# Altium schematic symbol library AD_Lib.SchLib: 1239 symbols (part 5 of 9) (continued)
## J_ESQ-116-33-L-D
designator J?, comment F2*8
Ë«ÅÅÄ¸,2*8,2.54mm; Manufacturer: Samtec; other: Òý½Å¼ä¾à2.54mm; Quality: -55~105¡ãC; pro-environment: RoHS; SN: 03.4.31.35.99EQ1601S; OPN: ESQ-116-33-L-D; PadsNum: 0; Value: Ë«ÅÅÄ¸,2*8; Category: Á¬½ÓÆ÷; Part: F2*8; Price: ?; OPN_JLC: OPN_JLC; SN_JLC: SN_JLC; Price_JLC: 0
footprint HDR2*8 (Connector; Header; 8x2 Position;Pitch=2.54mm)
pins: 1, 2, 3, 4, 5, 6, 7, 8, 9, 10, 11, 12, 13, 14

## J_HDR1*2
designator J?, comment HDR1*2
µ¥ÅÅÄ¸,1*2; Manufacturer: Samtec; other: Òý½Å¼ä¾à2.54mm; Quality: -55~105¡ãC; pro-environment: RoHS; Value: µ¥ÅÅÄ¸£¬1*2; PadsNum: 0; SN: SN; Category: Á¬½ÓÆ÷; OPN: HDR1*2; Part: HDR1*2; Price: ?; OPN_JLC: OPN_JLC; SN_JLC: SN_JLC; Price_JLC: 0
footprint J_VH3.96-2P
pins: 1, 2

## J_HDR1*3
designator J?, comment HDR1*3
µ¥ÅÅÄ¸,1*32.54mm; Manufacturer: Samtec; other: Òý½Å¼ä¾à2.54mm; Quality: -55~105¡ãC; pro-environment: RoHS; Value: µ¥ÅÅÄ¸£¬1*3; PadsNum: 0; SN: SN; Category: Á¬½ÓÆ÷; OPN: HDR1*3; Part: HDR1*3; Price: ?; OPN_JLC: OPN_JLC; SN_JLC: SN_JLC; Price_JLC: 0
footprint J_HDR1*3 (µ¥ÅÅÕë)
pins: 1, 2, 3

## J_HDR1*4
designator J?, comment HDR1*4
µ¥ÅÅÄ¸,1*4,2.54mm; Manufacturer: Samtec; other: Òý½Å¼ä¾à2.54mm; Quality: -55~105¡ãC; pro-environment: RoHS; Value: µ¥ÅÅÄ¸£¬1*4; PadsNum: 0; SN: SN; Category: Á¬½ÓÆ÷; OPN: HDR1*4; Part: HDR1*4; Price: ?; OPN_JLC: OPN_JLC; SN_JLC: SN_JLC; Price_JLC: 0
footprint J_HDR1*4 (Connector; Header; 1*4)
footprint J_VH3.96-4P
pins: 1, 2, 3, 4

## J_HDR1*5
designator J?, comment HDR1*5
µ¥ÅÅÄ¸,1*5,2.54mm; Manufacturer: Samtec; other: Òý½Å¼ä¾à2.54mm; Quality: -55~105¡ãC; pro-environment: RoHS; Value: µ¥ÅÅÄ¸£¬1*5; PadsNum: 0; SN: SN; Category: Á¬½ÓÆ÷; OPN: HDR1*5; Part: HDR1*5; Price: ?; OPN_JLC: OPN_JLC; SN_JLC: SN_JLC; Price_JLC: 0
footprint J_HDR1*5 (Connector; Header; 1*5)
pins: 1, 2, 3, 4, 5

## J_HDR1*6
designator J?, comment HDR1*6
µ¥ÅÅÄ¸,1*6,2.54mm; Manufacturer: Samtec; other: Òý½Å¼ä¾à2.54mm; Quality: -55~105¡ãC; pro-environment: RoHS; Value: µ¥ÅÅÄ¸£¬1*6; PadsNum: 0; SN: SN; Category: Á¬½ÓÆ÷; OPN: HDR1*6; Part: HDR1*6; Price: ?; OPN_JLC: OPN_JLC; SN_JLC: SN_JLC; Price_JLC: 0
footprint HDR1*6 (Footprint not found)
footprint J_VH3.96-6P (Footprint not found)
pins: 1, 2, 3, 4, 5, 6

## J_HDR1*7
designator J?, comment HDR1*7
µ¥ÅÅÄ¸,1*7,2.54mm; Manufacturer: Samtec; other: Òý½Å¼ä¾à2.54mm; Quality: -55~105¡ãC; pro-environment: RoHS; Value: µ¥ÅÅÄ¸£¬1*7; PadsNum: 0; SN: SN; Category: Á¬½ÓÆ÷; OPN: HDR1*7; Part: HDR1*7; Price: ?; OPN_JLC: OPN_JLC; SN_JLC: SN_JLC; Price_JLC: 0
footprint J_XH2.54-7P (Footprint not found)
footprint J_A2006WF-08A (Footprint not found)
pins: 1, 2, 3, 4, 5, 6, 7

## J_HDR1*8
designator J?, comment HDR1*8
µ¥ÅÅÄ¸,1*8,2.54mm; Manufacturer: Samtec; other: Òý½Å¼ä¾à2.54mm; Quality: -55~105¡ãC; pro-environment: RoHS; Value: µ¥ÅÅÄ¸£¬1*8; OPN: HDR1*5; PadsNum: 0; SN: SN; Category: Á¬½ÓÆ÷; Part: HDR1*8; Price: ?; OPN_JLC: OPN_JLC; SN_JLC: SN_JLC; Price_JLC: 0
footprint J_XH2.54-8P (Footprint not found)
footprint J_A2006WF-08A (Footprint not found)
pins: 1, 2, 3, 4, 5, 6, 7, 8

## J_HDR1*9
designator J?, comment HDR1*9
µ¥ÅÅÄ¸,1*8,2.54mm; Manufacturer: Samtec; other: Òý½Å¼ä¾à2.54mm; Quality: -55~105¡ãC; pro-environment: RoHS; Value: µ¥ÅÅÄ¸£¬1*9; PadsNum: 0; SN: SN; Category: Á¬½ÓÆ÷; OPN: HDR1*9; Part: HDR1*9; Price: ?; OPN_JLC: OPN_JLC; SN_JLC: SN_JLC; Price_JLC: 0
footprint J_XH2.54-8P (Footprint not found)
footprint J_A2006WF-08A (Footprint not found)
pins: 1, 2, 3, 4, 5, 6, 7, 8, 9

## J_HDR1*10
designator J?, comment HDR1*8
µ¥ÅÅÄ¸,1*10,2.54mm; Manufacturer: Samtec; other: Òý½Å¼ä¾à2.54mm; Quality: -55~105¡ãC; pro-environment: RoHS; Value: µ¥ÅÅÄ¸£¬1*10; OPN: HDR1*5; PadsNum: 0; SN: SN; Category: Á¬½ÓÆ÷; Part: HDR1*8; Price: ?; OPN_JLC: OPN_JLC; SN_JLC: SN_JLC; Price_JLC: 0
footprint J_VH3.96-10P (Footprint not found)
footprint J_XH2.54-10P (µ¥ÅÅ²å×ù)
pins: 1, 2, 3, 4, 5, 6, 7, 8, 9, 10

## J_HDR1*15
designator J?, comment HDR1*8
µ¥ÅÅÄ¸,1*15,2.54mm; Manufacturer: Samtec; other: Òý½Å¼ä¾à2.54mm; Quality: -55~105¡ãC; pro-environment: RoHS; Value: µ¥ÅÅÄ¸£¬1*10; OPN: HDR1*5; PadsNum: 0; SN: SN; Category: Á¬½ÓÆ÷; Part: HDR1*8; Price: ?; OPN_JLC: OPN_JLC; SN_JLC: SN_JLC; Price_JLC: 0
footprint J_VH3.96-10P (Footprint not found)
footprint J_XH2.54-10P (µ¥ÅÅ²å×ù)
pins: 1, 2, 3, 4, 5, 6, 7, 8, 9, 10, 11, 12, 13, 14, 15

## J_HDR2*3
designator J?, comment HDR2*3
Ë«ÅÅÄ¸,2*3,2.54mm; Manufacturer: Samtec; other: Òý½Å¼ä¾à2.54mm; Quality: -55~105¡ãC; pro-environment: RoHS; Value: Ë«ÅÅÄ¸£¬2*3; PadsNum: 0; SN: SN; Category: Á¬½ÓÆ÷; OPN: HDR2*3; Part: HDR2*3; Price: ?; OPN_JLC: OPN_JLC; SN_JLC: SN_JLC; Price_JLC: 0
footprint HDR2*3 (Connector; Header; 3x2 Position;Pitch=2.54mm)
pins: 1, 2, 3, 4, 5, 6

## J_HDR2*4
designator J?, comment HDR2*4
Ë«ÅÅÄ¸,2*4,2.54mm; Manufacturer: Samtec; other: Òý½Å¼ä¾à2.54mm; Quality: -55~105¡ãC; pro-environment: RoHS; Value: Ë«ÅÅÄ¸£¬2*4; PadsNum: 0; SN: SN; Category: Á¬½ÓÆ÷; OPN: HDR2*4; Part: HDR2*4; Price: ?; OPN_JLC: OPN_JLC; SN_JLC: SN_JLC; Price_JLC: 0
footprint HDR2*4 (Connector; Header; 2*4)
pins: 1, 2, 3, 4, 5, 6, 7, 8

## J_HDR2*5
designator J?, comment HDR2*5
Ë«ÅÅÄ¸,2*5,2.54mm; Manufacturer: Samtec; other: Òý½Å¼ä¾à2.54mm; Quality: -55~105¡ãC; pro-environment: RoHS; Value: Ë«ÅÅÄ¸£¬2*5; PadsNum: 0; SN: SN; Category: Á¬½ÓÆ÷; OPN: HDR2*5; Part: HDR2*5; Price: ?; OPN_JLC: OPN_JLC; SN_JLC: SN_JLC; Price_JLC: 0
footprint J_HDR2*5 (Connector; Header; 2*5)
pins: 1, 2, 3, 4, 5, 6, 7, 8, 9, 10

## J_HDR2*7
designator J?, comment HDR2*7
Ë«ÅÅÕë,2*7,2.54mm; Manufacturer: Wurth; other: Òý½Å¼ä¾à2.54mm; Quality: -55~105¡ãC; pro-environment: RoHS; SN: 03.4.31.13.99142101S; Value: Ë«ÅÅÕë£¬2*7; OPN: 613 014 211 21; PadsNum: 0; Category: Á¬½ÓÆ÷; Part: HDR2*7; QTY: 1000; Price: 3.5568; OPN_JLC: OPN_JLC; SN_JLC: SN_JLC; Price_JLC: 0
footprint J_HDR2*7 (Connector; Header; 2*7)
pins: 1, 2, 3, 4, 5, 6, 7, 8, 9, 10, 11, 12, 13, 14

## J_HDR2*8
designator J?, comment HDR2*7
Ë«ÅÅÕë,2*7,2.54mm; Manufacturer: Wurth; other: Òý½Å¼ä¾à2.54mm; Quality: -55~105¡ãC; pro-environment: RoHS; SN: 03.4.31.13.99142101S; Value: Ë«ÅÅÕë£¬2*7; OPN: 613 014 211 21; PadsNum: 0; Category: Á¬½ÓÆ÷; Part: HDR2*7; QTY: 1000; Price: 3.5568; OPN_JLC: OPN_JLC; SN_JLC: SN_JLC; Price_JLC: 0
footprint 2EDGKRH-5.08-2*8P_B (2EDG-5.08²å°ÎÊ½½ÓÏß¶Ë×Ó£¬ÍäÕë×ù£¬Ë«ÅÅ£»£¨·ï»Ë¶Ë×Ó£©)
pins: 1, 2, 3, 4, 5, 6, 7, 8, 9, 10, 11, 12, 13, 14, 15, 16

## J_HDR2*9
designator J?, comment HDR2*9
Ë«ÅÅÕë,2*9,2.54mm; other: Òý½Å¼ä¾à2.54mm; Quality: -55~105¡ãC; pro-environment: RoHS; Value: Ë«ÅÅÕë£¬2*9; PadsNum: 0; SN: SN; Category: Á¬½ÓÆ÷; Part: HDR2*9; QTY: 500; OPN_JLC: OPN_JLC; SN_JLC: SN_JLC; Price_JLC: 0
footprint HDR2*9 (Footprint not found)
pins: 1, 2, 3, 4, 5, 6, 7, 8, 9, 10, 11, 12, 13, 14, 15, 16, 17, 18

## J_HDR2*10
designator J?, comment HDR2*10
Ë«ÅÅÕë,2*10,2.54mm; Manufacturer: Wurth; other: Òý½Å¼ä¾à2.54mm; Quality: -55~105¡ãC; pro-environment: RoHS; Value: Ë«ÅÅÕë£¬2*10; OPN: 613 020 211 21; PadsNum: 0; SN: SN; Category: Á¬½ÓÆ÷; Part: HDR2*10; QTY: 500; Price: 5.1714; OPN_JLC: OPN_JLC; SN_JLC: SN_JLC; Price_JLC: 0
footprint J_HDR2*10 (Connector; Header; 2*8)
pins: 1, 2, 3, 4, 5, 6, 7, 8, 9, 10, 11, 12, 13, 14, 15, 16, 17, 18, 19, 20

## J_HDR2*15
designator J?, comment HDR2*15
Ë«ÅÅÕë,2*15,2.54mm; Manufacturer: Wurth; other: Òý½Å¼ä¾à2.54mm; Quality: -55~105¡ãC; pro-environment: RoHS; Value: Ë«ÅÅÕë£¬2*15; OPN: 613 020 211 21; PadsNum: 0; SN: SN; Category: Á¬½ÓÆ÷; Part: HDR2*15; QTY: 500; Price: 5.1714; OPN_JLC: OPN_JLC; SN_JLC: SN_JLC; Price_JLC: 0
footprint HDR2*15 (Connector; Header; 2*15)
pins: 1, 2, 3, 4, 5, 6, 7, 8, 9, 10, 11, 12, 13, 14, 15, 16, 17, 18, 19, 20, 21, 22, 23, 24, 25, 26, 27, 28, 29, 30

## J_HDR2*16
designator J?, comment HDR2*16
Ë«ÅÅÕë,2*16,2.54mm; Manufacturer: Wurth; other: Òý½Å¼ä¾à2.54mm; Quality: -55~105¡ãC; pro-environment: RoHS; Value: Ë«ÅÅÕë£¬2*16; PadsNum: 0; SN: SN; Category: Á¬½ÓÆ÷; Part: HDR2*16; QTY: 500; OPN_JLC: OPN_JLC; SN_JLC: SN_JLC; Price_JLC: 0
footprint HDR2*16 (Footprint not found)
pins: 1, 2, 3, 4, 5, 6, 7, 8, 9, 10, 11, 12, 13, 14, 15, 16, 17, 18, 19, 20, 21, 22, 23, 24, 25, 26, 27, 28, 29, 30, 31, 32

## J_HDR2*17
designator J?, comment HDR2*17
Ë«ÅÅÕë,2*172.54mm; Manufacturer: Wurth; other: Òý½Å¼ä¾à2.54mm; Quality: -55~105¡ãC; pro-environment: RoHS; Value: Ë«ÅÅÕë£¬2*17; PadsNum: 0; SN: SN; Category: Á¬½ÓÆ÷; Part: HDR2*17; QTY: 500; OPN_JLC: OPN_JLC; SN_JLC: SN_JLC; Price_JLC: 0
footprint HDR2*17 (Footprint not found)
pins: 1, 2, 3, 4, 5, 6, 7, 8, 9, 10, 11, 12, 13, 14, 15, 16, 17, 18, 19, 20, 21, 22, 23, 24, 25, 26, 27, 28, 29, 30, 31, 32, 33, 34

## J_HDR2*18
designator J?, comment HDR2*18
Ë«ÅÅÕë,2*18,2.54mm; Manufacturer: Wurth; other: Òý½Å¼ä¾à2.54mm; Quality: -55~105¡ãC; pro-environment: RoHS; Value: Ë«ÅÅÕë£¬2*18; PadsNum: 0; SN: SN; Category: Á¬½ÓÆ÷; Part: HDR2*18; QTY: 500; OPN_JLC: OPN_JLC; SN_JLC: SN_JLC; Price_JLC: 0
footprint J_HDR2*18 (Connector; Header; 2*18)
pins: 1, 2, 3, 4, 5, 6, 7, 8, 9, 10, 11, 12, 13, 14, 15, 16, 17, 18, 19, 20, 21, 22, 23, 24, 25, 26, 27, 28, 29, 30, 31, 32, 33, 34, 35, 36

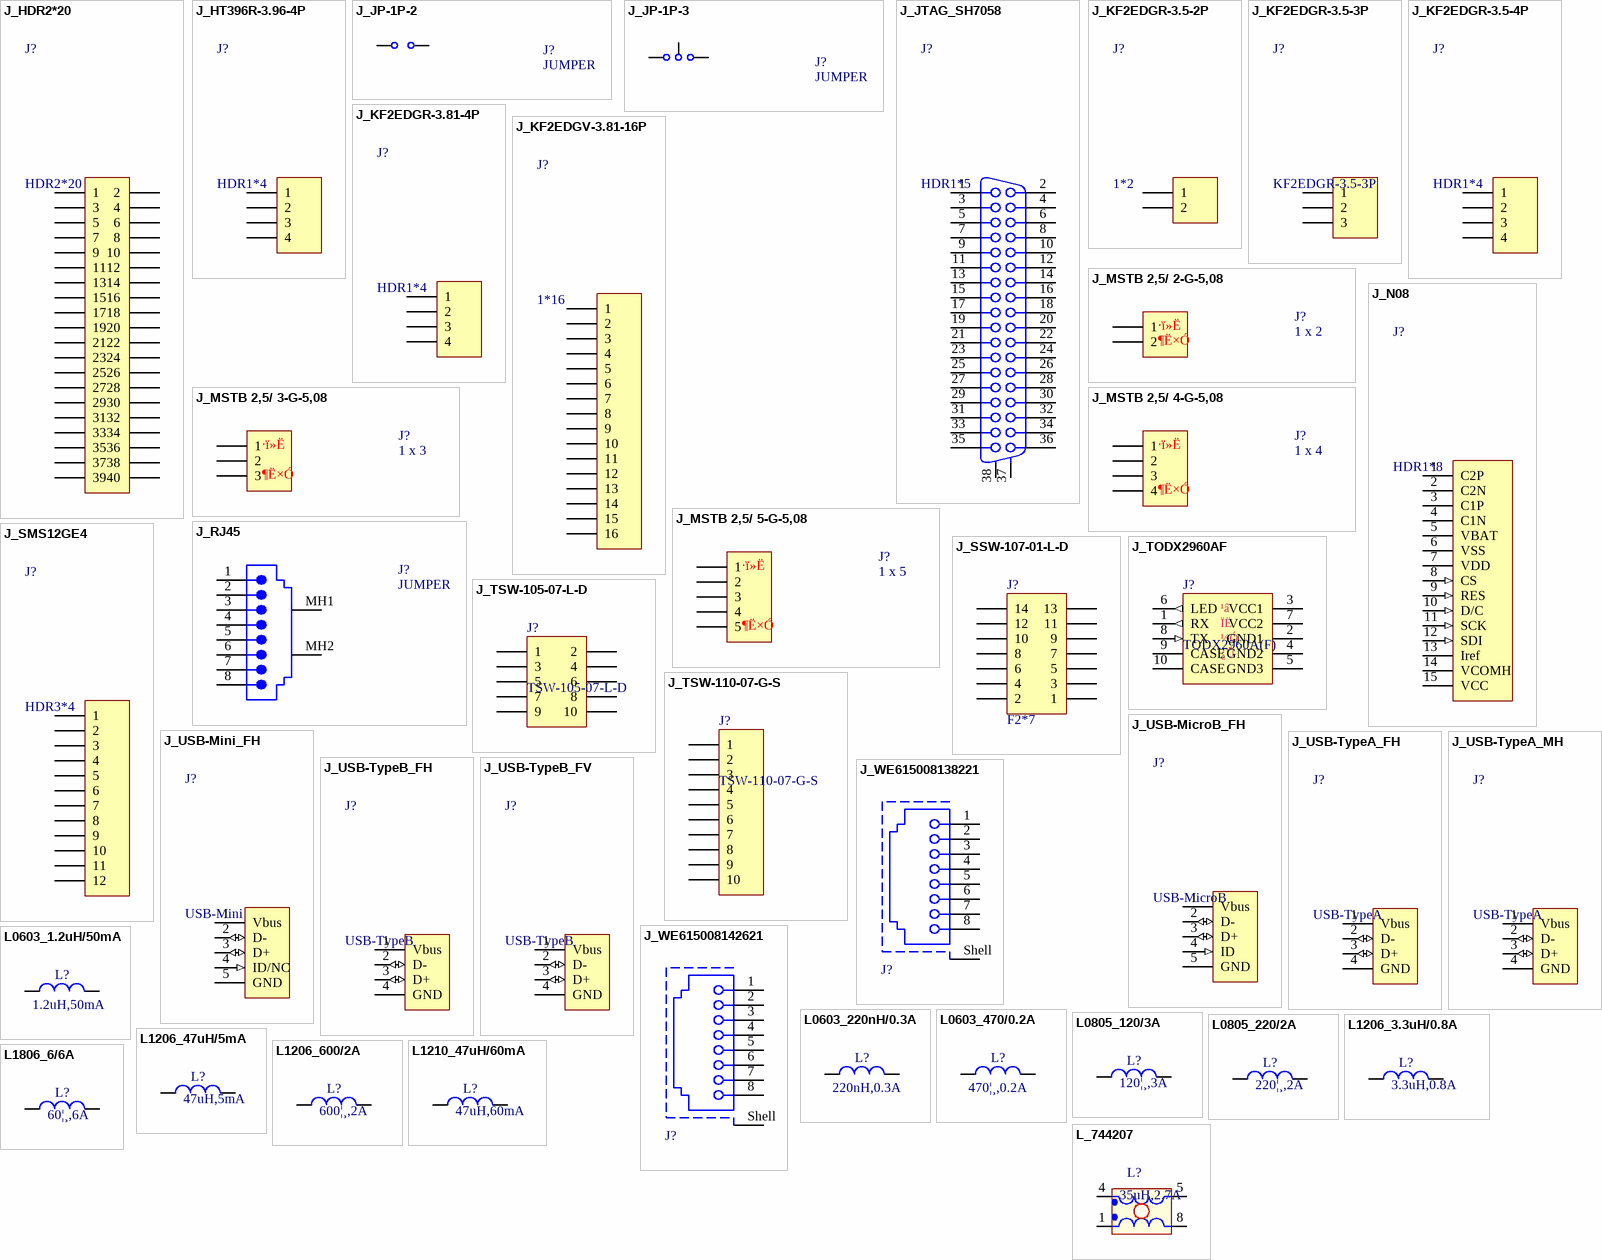
[diagram p24: symbols J_HDR2*20 to L_744207]

## J_HDR2*20
designator J?, comment HDR2*20
Ë«ÅÅÕë,2*20,2.54mm; Manufacturer: Wurth; other: Òý½Å¼ä¾à2.54mm; Quality: -55~105¡ãC; pro-environment: RoHS; Value: Ë«ÅÅÕë£¬2*20; PadsNum: 0; SN: SN; Category: Á¬½ÓÆ÷; Part: HDR2*20; QTY: 500; OPN_JLC: OPN_JLC; SN_JLC: SN_JLC; Price_JLC: 0
footprint J_HDR2*20 (Connector; Header; 2*20)
pins: 1, 2, 3, 4, 5, 6, 7, 8, 9, 10, 11, 12, 13, 14, 15, 16, 17, 18, 19, 20, 21, 22, 23, 24, 25, 26, 27, 28, 29, 30, 31, 32, 33, 34, 35, 36, 37, 38, 39, 40

## J_HT396R-3.96-4P
designator J?, comment HDR1*4
·ï»Ë¶Ë×Ó; 3.96mm; ²å°ÎÊ½; Manufacturer: ¿Æ·¢; other: P=3.96mm; Quality: -55~105¡ãC; pro-environment: RoHS; Value: 1*4; OPN: HT396R-3.96-4P; PadsNum: 0; SN: SN; Category: Á¬½ÓÆ÷; Part: HDR1*4; QTY: 200; Price: 0.281145; OPN_JLC: HT396R-3.96-4P; SN_JLC: C577801; Price_JLC: 0.281145
footprint J_HT396R-4P (Footprint not found)
footprint J_VH3.96-4P
pins: 1, 2, 3, 4

## J_JP-1P-2
designator J?, comment JUMPER
µ¥ÅÅÕë,1*2,2.54mm; Manufacturer: SAMTEC; Value: 3A,450V; pro-environment: RoHS; OPN: TSW-102-07-L-S; Quality: -40~80¡ãC; PadsNum: 0; SN: SN; Category: Á¬½ÓÆ÷; Part: JUMPER; Price: ?; OPN_JLC: OPN_JLC; SN_JLC: SN_JLC; Price_JLC: 0
footprint JP1*2 (ÌøÏß£¬1¸ö)
pins: 1, 2

## J_JP-1P-3
designator J?, comment JUMPER
µ¥ÅÅÕë; 1*3; 2.54mm; Manufacturer: SAMTEC; Value: 3A,450V; pro-environment: RoHS; OPN: TSW-102-07-L-S; Quality: -40~80¡ãC; PadsNum: 0; SN: SN; Category: Á¬½ÓÆ÷; Part: JUMPER; Price: ?; OPN_JLC: OPN_JLC; SN_JLC: SN_JLC; Price_JLC: 0
footprint JP1*3 (ÌøÏß£¬1¸ö)
pins: 1, 2, 3

## J_JTAG_SH7058
designator J?, comment HDR1*5
SH7058µ÷ÊÔ½ÓÍ·; Manufacturer: Samtec; other: Òý½Å¼ä¾à1.27mm; Quality: -55~105¡ãC; pro-environment: RoHS; OPN: JTAG_SH7058; PadsNum: 0; SN: SN; Value: SH7058µ÷ÊÔ½ÓÍ·; Category: Á¬½ÓÆ÷; Part: HDR1*5; Price: ?; OPN_JLC: OPN_JLC; SN_JLC: SN_JLC; Price_JLC: 0
footprint JTAG_SH7058 (SH7058µ÷ÊÔ½ÓÍ·)
pins: 1, 2, 3, 4, 5, 6, 7, 8, 9, 10, 11, 12, 13, 14, 15, 16, 17, 18, 19, 20, 21, 22, 23, 24, 25, 26, 27, 28, 29, 30, 31, 32, 33, 34, 35, 36, 37 MH1, 38 MH2

## J_KF2EDGR-3.5-2P
designator J?, comment 1*2
·ï»Ë¶Ë×Ó; 3.5mm; ²å°ÎÊ½; Manufacturer: ¿Æ·¢; Part: KF2EDGR-3.5-3P; other: P=3.5mm; Quality: -55~105¡ãC; pro-environment: RoHS; OPN: KF2EDGR-3.5-2P; PadsNum: 0; SN: SN; Value: 1*2; Category: Á¬½ÓÆ÷; QTY: 500; Price: ?; OPN_JLC: KF2EDGR-3.5-2P; SN_JLC: C441171; Price_JLC: 0.251911
footprint J_KF2EDGR-3.5-2P (Footprint not found)
footprint J_VH3.96-4P
pins: 1, 2

## J_KF2EDGR-3.5-3P
designator J?, comment KF2EDGR-3.5-3P
·ï»Ë¶Ë×Ó; 3.5mm; ²å°ÎÊ½; Manufacturer: ¿Æ·¢; other: P=3.5mm; Quality: -55~105¡ãC; pro-environment: RoHS; Value: 1*3; PadsNum: 0; SN: SN; Category: Á¬½ÓÆ÷; OPN: KF2EDGR-3.5-3P; Part: KF2EDGR-3.5-3P; QTY: 200; Price: 0.532292; OPN_JLC: KF2EDGR-3.5-3P; SN_JLC: C441172; Price_JLC: 0.420042
footprint J_KF2EDGR-3.5-3P (Footprint not found)
footprint J_VH3.96-4P
pins: 1, 2, 3

## J_KF2EDGR-3.5-4P
designator J?, comment HDR1*4
·ï»Ë¶Ë×Ó; 3.5mm; ²å°ÎÊ½; Manufacturer: ¿Æ·¢; other: P=3.5mm; Quality: -55~105¡ãC; pro-environment: RoHS; Value: 1*4; OPN: KF2EDGR-3.5-4P; PadsNum: 0; SN: SN; Category: Á¬½ÓÆ÷; Part: HDR1*4; QTY: 200; Price: 0.532292; OPN_JLC: KF2EDGR-3.5-4P; SN_JLC: C441173; Price_JLC: 0.532292
footprint J_KF2EDGR-3.5-4P (¿Æ·¢KF2EDGR-3.5ÏµÁÐ·ï»Ë¶Ë×Ó£¬ÍäÕë)
footprint J_VH3.96-4P
pins: 1, 2, 3, 4

## J_KF2EDGR-3.81-4P
designator J?, comment HDR1*4
·ï»Ë¶Ë×Ó; 3.81mm; ²å°ÎÊ½; Manufacturer: ¿Æ·¢; other: P=3.81mm; Quality: -55~105¡ãC; pro-environment: RoHS; Value: 1*4; OPN: KF2EDGR-3.81-4P; PadsNum: 0; SN: SN; Category: Á¬½ÓÆ÷; Part: HDR1*4; QTY: 200; Price: 0.478678; OPN_JLC: KF2EDGR-3.81-4P; SN_JLC: C441184; Price_JLC: 0.478678
footprint J_KF2EDGR-3.81-4P (¿Æ·¢KF2EDGR-3.81ÏµÁÐ·ï»Ë¶Ë×Ó£¬ÍäÕë)
footprint J_VH3.96-4P
pins: 1, 2, 3, 4

## J_KF2EDGV-3.81-16P
designator J?, comment 1*16
·ï»Ë¶Ë×Ó; 1*16; 3.81mm; Manufacturer: KEFA; other: P=3.81mm; Quality: -55~105¡ãC; pro-environment: RoHS; OPN: KF2EDGV-3.81-16P; PadsNum: 0; SN: SN; Value: 1*16; Category: Á¬½ÓÆ÷; Part: 1*16; QTY: 100; Price: ?; OPN_JLC: KF2EDGV-3.81-16P; SN_JLC: C441331; Price_JLC: 1.58
footprint J_KF2EDGV-3.81-16P_MUL (Òý½Å¼ä¾à3.81mm£¬Ö±Õë¡£¶à¸öÁ¬½ÓÆ÷²¢ÅÅ£¬¿¼ÂÇÄ¸Í·³ß´ç)
footprint J_KF2EDGV-3.81-16P (Òý½Å¼ä¾à3.81mm£¬Ö±Õë)
pins: 1, 2, 3, 4, 5, 6, 7, 8, 9, 10, 11, 12, 13, 14, 15, 16

## J_MSTB 2,5/ 2-G-5,08
designator J?, comment 1 x 2
²å°ÎÊ½·ï»Ë¶Ë×Ó£¬»ù×ù£¬1*2; Manufacturer: Phoenix Contact; Value: 12A;250V; pro-environment: RoHS; OPN: MSTB 2,5/ 2-G-5,08; Quality: -55~125¡ãC; other: ²åÍ· MSTB 2,5/ 2-ST-5,08; PadsNum: 0; SN: SN; Category: Á¬½ÓÆ÷; Part: 1 x 2; QTY: 100; Price: ?; OPN_JLC: OPN_JLC; SN_JLC: SN_JLC; Price_JLC: 0
footprint J_2EDG-5.08-2P_B (2EDG-5.08²å°ÎÊ½½ÓÏß¶Ë×Ó£¬ÍäÕë×ù£»£¨·ï»Ë¶Ë×Ó£©)
pins: 1, 2
text: ·ï»Ë; ¶Ë×Ó

## J_MSTB 2,5/ 3-G-5,08
designator J?, comment 1 x 3
²å°ÎÊ½·ï»Ë¶Ë×Ó£¬»ù×ù£¬1*3; Manufacturer: Phoenix Contact; Value: 12A;250V; pro-environment: RoHS; OPN: MSTB 2,5/ 3-G-5,08; Quality: -55~125¡ãC; other: ²åÍ· MSTB 2,5/ 3-ST-5,08; PadsNum: 0; SN: SN; Category: Á¬½ÓÆ÷; Part: 1 x 3; QTY: 100; Price: ?; OPN_JLC: OPN_JLC; SN_JLC: SN_JLC; Price_JLC: 0
footprint J_2EDG-5.08-3P_B (2EDG-5.08²å°ÎÊ½½ÓÏß¶Ë×Ó£¬ÍäÕë×ù£»£¨·ï»Ë¶Ë×Ó£©)
pins: 1, 2, 3
text: ·ï»Ë; ¶Ë×Ó

## J_MSTB 2,5/ 4-G-5,08
designator J?, comment 1 x 4
²å°ÎÊ½·ï»Ë¶Ë×Ó£¬»ù×ù£¬1*4; Manufacturer: Phoenix Contact; Value: 12A;250V; pro-environment: RoHS; OPN: MSTB 2,5/ 4-G-5,08; Quality: -55~125¡ãC; other: ²åÍ· MSTB 2,5/ 4-ST-5,08; PadsNum: 0; SN: SN; Category: Á¬½ÓÆ÷; Part: 1 x 4; QTY: 100; Price: ?; OPN_JLC: OPN_JLC; SN_JLC: SN_JLC; Price_JLC: 0
footprint J_2EDG-5.08-4P_B (2EDG-5.08²å°ÎÊ½½ÓÏß¶Ë×Ó£¬ÍäÕë×ù£»£¨·ï»Ë¶Ë×Ó£©)
pins: 1, 2, 3, 4
text: ·ï»Ë; ¶Ë×Ó

## J_MSTB 2,5/ 5-G-5,08
designator J?, comment 1 x 5
²å°ÎÊ½·ï»Ë¶Ë×Ó£¬»ù×ù£¬1*5; Manufacturer: Phoenix Contact; Value: 12A;250V; pro-environment: RoHS; OPN: MSTB 2,5/ 5-G-5,08; Quality: -55~125¡ãC; other: ²åÍ· MSTB 2,5/ 5-ST-5,08; PadsNum: 0; SN: SN; Category: Á¬½ÓÆ÷; Part: 1 x 5; QTY: 100; Price: ?; OPN_JLC: OPN_JLC; SN_JLC: SN_JLC; Price_JLC: 0
footprint J_2EDG-5.08-5P_B (2EDG-5.08²å°ÎÊ½½ÓÏß¶Ë×Ó£¬ÍäÕë×ù£»£¨·ï»Ë¶Ë×Ó£©)
pins: 1, 2, 3, 4, 5
text: ·ï»Ë; ¶Ë×Ó

## J_N08
designator J?, comment HDR1*8
µ¥ÅÅÄ¸,1*15,2.54mm; Manufacturer: Samtec; other: Òý½Å¼ä¾à2.54mm; Quality: -55~105¡ãC; pro-environment: RoHS; Value: µ¥ÅÅÄ¸£¬1*10; OPN: HDR1*5; PadsNum: 0; SN: SN; Category: Á¬½ÓÆ÷; Part: HDR1*8; Price: ?; OPN_JLC: OPN_JLC; SN_JLC: SN_JLC; Price_JLC: 0
footprint J_NFP1316-05 (FFC/FPC±âÆ½µçÀÂ²å×ù£¬15Pin£¬¼ä¾à0.6mm)
footprint J_XH2.54-10P (µ¥ÅÅ²å×ù)
pins: 1 C2P, 2 C2N, 3 C1P, 4 C1N, 5 VBAT (power), 6 VSS (power), 7 VDD (power), 8 CS (in), 9 RES (in), 10 D/C (in), 11 SCK (in), 12 SDI (in), 13 Iref, 14 VCOMH, 15 VCC (power)

## J_RJ45
designator J?, comment JUMPER
RJ45,ÒÔÌ«Íø¶Ë×Ó; Manufacturer: SAMTEC; Value: 3A,450V; pro-environment: RoHS; OPN: TSW-102-07-L-S; Quality: -40~80¡ãC; PadsNum: 0; SN: SN; Category: Á¬½ÓÆ÷; Part: JUMPER; Price: ?; OPN_JLC: OPN_JLC; SN_JLC: SN_JLC; Price_JLC: 0
footprint RJ45 (Footprint not found)
pins: 1, 2, 3, 4, 5, 6, 7, 8, MH1 Shield, MH2 Shield

## J_SMS12GE4
designator J?, comment HDR3*4
°åÔØÁ¬½ÓÆ÷; Male; 3*4; 5.08mm; Manufacturer: Souriau; other: Òý½Å¼ä¾à5.08mm; Quality: -55~105¡ãC; pro-environment: RoHS; OPN: SMS12GE4; PadsNum: 0; SN: SN; Value: 3*4; Category: Á¬½ÓÆ÷; Part: HDR3*4; Price: 60; OPN_JLC: OPN_JLC; SN_JLC: SN_JLC; Price_JLC: 0
footprint J_SMS12 (Footprint not found)
pins: 1, 2, 3, 4, 5, 6, 7, 8, 9, 10, 11, 12

## J_SSW-107-01-L-D
designator J?, comment F2*7
Ë«ÅÅÄ¸,2*7,2.54mm; Manufacturer: Samtec; other: Òý½Å¼ä¾à2.54mm; Quality: -55~105¡ãC; pro-environment: RoHS; SN: 03.4.31.13.99107101S; Value: Ë«ÅÅÄ¸£¬2*7; OPN: SSW-107-01-L-D; PadsNum: 0; Category: Á¬½ÓÆ÷; Part: F2*7; Price: ?; OPN_JLC: OPN_JLC; SN_JLC: SN_JLC; Price_JLC: 0
footprint HDR2*7 (Connector; Header; 7x2 Position;Pitch=2.54mm)
pins: 1, 2, 3, 4, 5, 6, 7, 8, 9, 10, 11, 12, 13, 14

## J_TODX2960AF
designator J?, comment TODX2960A(F)
¹âÏË,Male,; Manufacturer: Toshiba; Quality: -40~85¡æ; Value: Female,10P; pro-environment: RoHS; other: ¹âÏË½Ó¿Ú£¬ÄÚÖÃÊÕ·¢Æ÷; PadsNum: 0; SN: SN; Category: Á¬½ÓÆ÷; OPN: TODX2960A(F); Part: TODX2960A(F); QTY: ?; Price: ?; OPN_JLC: OPN_JLC; SN_JLC: SN_JLC; Price_JLC: 0
footprint J_TODX2960AF (ToshibaÖ®JIS F07ÐÍ¹âÏË½Ó¿Ú)
pins: 1 RX (out), 2 GND1 (power), 3 VCC1 (power), 4 GND2 (power), 5 GND3 (power), 6 LED (out), 7 VCC2 (power), 8 TX (in), 9 CASE, 10 CASE
text: ¹â; ÏË; ½Ó; ¿Ú

## J_TSW-105-07-L-D
designator J?, comment TSW-105-07-L-D
Ë«ÅÅÕë,2*5,2.54mm; Manufacturer: Amphenol FCI; Quality: -50~125¡æ; Value: Male,10P; pro-environment: RoHS; other: Ë«ÅÅÕë£¬5*2; PadsNum: 0; SN: SN; Category: Á¬½ÓÆ÷; OPN: TSW-105-07-L-D; Part: TSW-105-07-L-D; QTY: 1000; Price: ?; OPN_JLC: OPN_JLC; SN_JLC: SN_JLC; Price_JLC: 0
footprint HDR2*5 (Connector; Header; 5x2 Position;Pitch=2.54mm)
pins: 1, 2, 3, 4, 5, 6, 7, 8, 9, 10

## J_TSW-110-07-G-S
designator J?, comment TSW-110-07-G-S
µ¥ÅÅÕë,1*10,2.54mm; Manufacturer: Samtec; Quality: -50~125¡æ; Value: Male,1*10; pro-environment: RoHS; SN: 03.4.31.13.99SW1001S; other: µ¥ÅÅÕë;1*10;2.54mm; PadsNum: 0; Category: Á¬½ÓÆ÷; OPN: TSW-110-07-G-S; Part: TSW-110-07-G-S; QTY: 3; Price: 14.5548; OPN_JLC: OPN_JLC; SN_JLC: SN_JLC; Price_JLC: 0
footprint HDR1*10 (Connector; Header; 1*10)
pins: 1, 2, 3, 4, 5, 6, 7, 8, 9, 10

## J_USB-MicroB_FH
designator J?, comment USB-MicroB
USB; Micro B; Female; SMT; Manufacturer: Amphenol; Quality: 0~70¡ãC; pro-environment: RoHS; Value: USB, Micro B, Female; OPN: 10118194-0001LF; PadsNum: 5; other: USB; Micro B; Female; SMT; SN: SN; Category: Á¬½ÓÆ÷; Part: USB-MicroB; QTY: 1000; Price: 1.3488; OPN_JLC: 920-E52A2021S10100; SN_JLC: C10418; Price_JLC: 0.367502
footprint J_USB-MicroB_FH (USB connector; Micro-B Receptacle; SMT)
pins: 1 Vbus (power), 2 D- (io), 3 D+ (io), 4 ID (in), 5 GND (power)

## J_USB-Mini_FH
designator J?, comment USB-Mini
USB; Mini B; Female; SMT; Manufacturer: º«¹úº«ÈÙ; Quality: 0~70¡ãC; pro-environment: RoHS; Value: USB, Mini B, Female; OPN: U-M-M5SS-W-2; PadsNum: 9; other: USB; Mini B; Female; SMT; SN: SN; Category: Á¬½ÓÆ÷; Part: USB-Mini; QTY: 1000; Price: 0.679865; OPN_JLC: 920-462A2021S10108; SN_JLC: C105424; Price_JLC: 0.250197
footprint J_USB-Mini_FH (Footprint not found)
pins: 1 Vbus (power), 2 D- (io), 3 D+ (io), 4 ID/NC (in), 5 GND (power)

## J_USB-TypeA_FH
designator J?, comment USB-TypeA
USB; Type A; Female; Angle; Manufacturer: TE; Quality: -30~80¡ãC; pro-environment: RoHS; Value: USB,Type A, Female; OPN: 292303-1; PadsNum: 0; other: USB; Type A; Female; Angle; SN: SN; Category: Á¬½ÓÆ÷; Part: USB-TypeA; QTY: 30; Price: 1.76; OPN_JLC: 902-131A1011D10100; SN_JLC: C2345; Price_JLC: 0.250197
footprint J_USB-TypeA_FH (USB - Type A£¬Ä¸×ù£¬Ë®Æ½°²×°£»902-131A1011D10100£¨C2345£©)
pins: 1 Vbus (power), 2 D- (io), 3 D+ (io), 4 GND (power)

## J_USB-TypeA_MH
designator J?, comment USB-TypeA
USB; Type A; Male; Angle; Manufacturer: TE; Quality: -30~80¡ãC; pro-environment: RoHS; Value: USB,Type A, Male; OPN: 292303-1; PadsNum: 0; other: USB; Type A; Male; Angle; SN: SN; Category: Á¬½ÓÆ÷; Part: USB-TypeA; QTY: 100; Price: 1.76; OPN_JLC: 917-181A102ED60200; SN_JLC: C9739; Price_JLC: 0.394356
footprint J_USB-TypeA_MH (USB - Type A£¬¹«Í·£¬Ë®Æ½°²×°£»917-181A102ED60200£¨C9739£©)
pins: 1 Vbus (power), 2 D- (io), 3 D+ (io), 4 GND (power)